# Altium footprint library Toi Library.PcbLib: 740 footprints (part 2 of 47)
Each footprint in its own frame and in the unit in brackets; x right, y up, seen from the top. Pads: shape width x height; smd on the part's side, far side on the other; paste and mask are expansions set on the pad; w line width, h text height; cw(c..) or ccw(c..) is an arc to the next point about the centre after c.
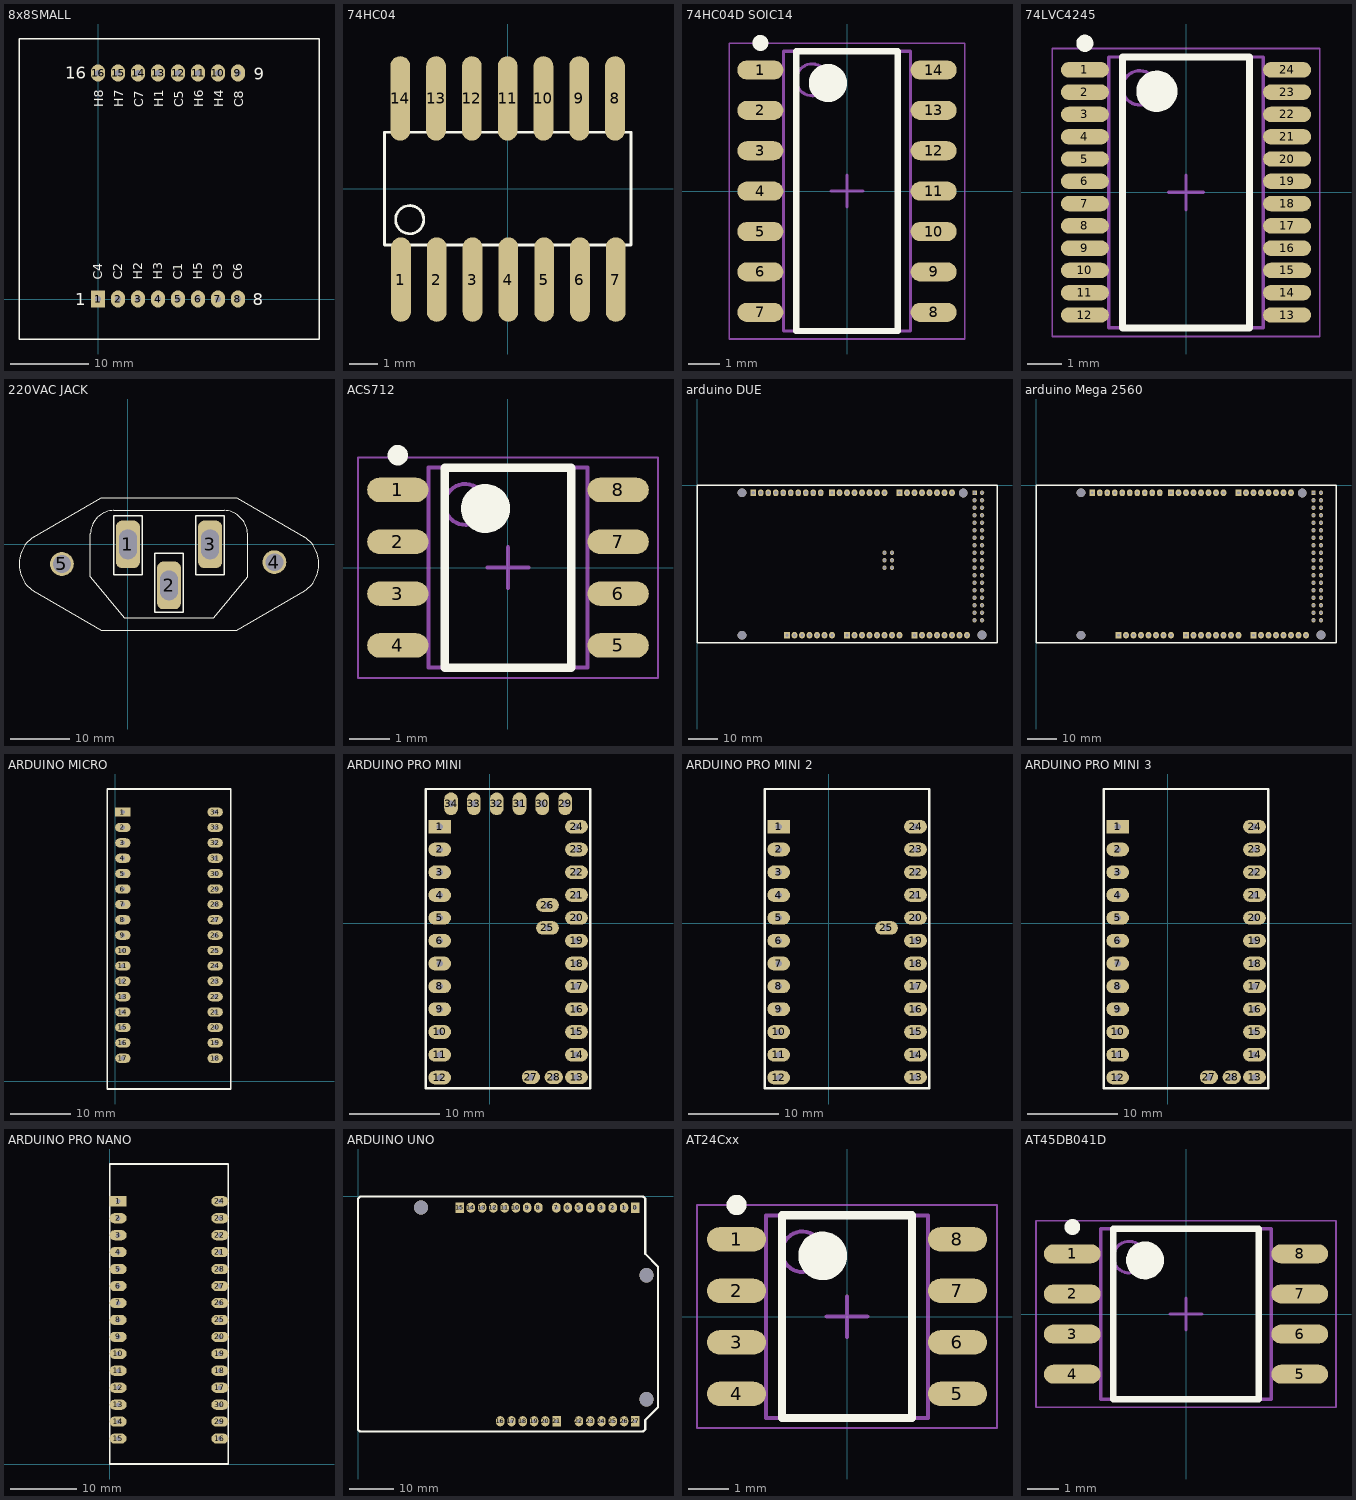
[diagram p1: the footprints below, top view; thin cyan lines are the x and y axes]

## 8x8SMALL [mil] "M15088, Matrix 8x8 - Body 38 X 38mm"
height 314.96
pads (16):
  rect 70x85 hole 31: 1(0,0)
  oval 70x85 hole 31: 2(100,0) 3(200,0) 4(300,0) 5(400,0) 6(500,0) 7(600,0) 8(700,0) 9(700,1129.92) 10(600,1129.92) 11(500,1129.92) 12(400,1129.92) 13(300,1129.92) 14(200,1129.92) 15(100,1129.92) 16(0,1129.92)
Top Overlay:
  lines w7: -395,-200 -395,1300 1105,1300 1105,-200 -395,-200
  text "H1" at 327.49,960 h45
  text "H2" at 222.49,96 h45
  text "H3" at 322.49,96 h45
  text "H4" at 627.49,960 h45
  text "16" at -165,1100 h60
  text "9" at 780,1095 h60
  text "8" at 775,-30 h60
  text "1" at -115,-30 h60
  text "C4" at 22.49,96 h45
  text "C3" at 622.49,96 h45
  text "C2" at 122.49,96 h45
  text "C1" at 422.49,96 h45
  text "C5" at 427.49,960 h45
  text "H5" at 522.49,96 h45
  text "H6" at 527.49,960 h45
  text "C6" at 722.49,96 h45
  text "H7" at 127.49,960 h45
  text "C7" at 227.49,960 h45
  text "H8" at 27.49,960 h45
  text "C8" at 727.49,960 h45

## 74HC04 [mm] "SOIC, 14-Leads, Body 8.7x3.9mm, Pitch 1.27mm, IPC Low Density"
height 1.75
pads (14):
  oval 0.7x3 smd: 1(-3.785,-3.226) 2(-2.515,-3.226) 3(-1.245,-3.226) 4(0.025,-3.226) 5(1.295,-3.226) 6(2.565,-3.226) 7(3.835,-3.226) 8(3.81,3.2) 9(2.54,3.2) 10(1.27,3.2) 11(0,3.2) 12(-1.27,3.2) 13(-2.54,3.2) 14(-3.81,3.2)
Top Layer:
  lines w0.254: 0,-3.2 0.025,-3.226
Top Overlay:
  circle w0.1: c-3.475,-1.1 r0.5
  lines w0.1: -4.375,-2 -4.375,2 4.375,2 4.375,-2 -4.375,-2
3D body "User Library-SOP14-p127-780.step": height 1.1, standoff 0, extent -5.08,-3.642 5.12,3.658

## 74HC04D SOIC14 [mm] "SOIC, 14-Leads, Body 8.65x3.90mm, Pitch 1.27mm, IPC Medium Density"
height 1.75
pads (14):
  oval 1.45x0.6 smd: 1(-2.725,3.81) 2(-2.725,2.54) 3(-2.725,1.27) 4(-2.725,0) 5(-2.725,-1.27) 6(-2.725,-2.54) 7(-2.725,-3.81) 8(2.725,-3.81) 9(2.725,-2.54) 10(2.725,-1.27) 11(2.725,0) 12(2.725,1.27) 13(2.725,2.54) 14(2.725,3.81)
Top Overlay:
  circle w0.25: c-2.725,4.66 r0.125
  circle w0.6: c-0.6,3.4 r0.3
  lines w0.2: -1.6,-4.4 -1.6,4.4 1.6,4.4 1.6,-4.4 -1.6,-4.4
Mechanical 13:
  circle w0.1: c-1.1,3.5 r0.5
  lines w0.1: -2,-4.4 -2,4.4 2,4.4 2,-4.4 -2,-4.4
Mechanical 15:
  lines w0.05: -3.7,-4.65 -3.7,4.65 3.7,4.65 3.7,-4.65 -3.7,-4.65
  lines w0.1: -0.5,0 0.5,0 ; 0,-0.5 0,0.5
3D body "74HC04D SOIC14.step": height 1.75, standoff 0, extent -3,-4.4 3,4.4

## 74LVC4245 [mm] "TSOP, 24-Leads, Body 7.80x4.40mm, Pitch 0.65mm, IPC Medium Density"
height 1
pads (24):
  oval 1.4x0.45 smd: 1(-2.95,3.575) 2(-2.95,2.925) 3(-2.95,2.275) 4(-2.95,1.625) 5(-2.95,0.975) 6(-2.95,0.325) 7(-2.95,-0.325) 8(-2.95,-0.975) 9(-2.95,-1.625) 10(-2.95,-2.275) 11(-2.95,-2.925) 12(-2.95,-3.575) 13(2.95,-3.575) 14(2.95,-2.925) 15(2.95,-2.275) 16(2.95,-1.625) 17(2.95,-0.975) 18(2.95,-0.325) 19(2.95,0.325) 20(2.95,0.975) 21(2.95,1.625) 22(2.95,2.275) 23(2.95,2.925) 24(2.95,3.575)
Top Overlay:
  circle w0.25: c-2.95,4.35 r0.125
  circle w0.6: c-0.85,2.95 r0.3
  lines w0.2: -1.85,-3.95 -1.85,3.95 1.85,3.95 1.85,-3.95 -1.85,-3.95
Mechanical 13:
  circle w0.1: c-1.35,3.05 r0.5
  lines w0.1: -2.25,-3.95 -2.25,3.95 2.25,3.95 2.25,-3.95 -2.25,-3.95
Mechanical 15:
  lines w0.05: -3.9,-4.2 -3.9,4.2 3.9,4.2 3.9,-4.2 -3.9,-4.2
  lines w0.1: -0.5,0 0.5,0 ; 0,-0.5 0,0.5
3D body "74LVC4245.step": height 1, standoff 0, extent -3.2,-3.95 3.2,3.95

## 220VAC JACK [mm]
pads (5):
  rrect50% 4x8 hole 3 slot 5 at 90 deg: 1(0,0) 2(6.903,-6.903) 3(13.807,0)
  round 4 hole 3: 4(24.612,-3.001) 5(-11.105,-3.302)
Top Overlay:
  lines w0.2: -15.923,-7.804 -4.486,-14.407 ; -15.923,1.201 -4.486,7.804 ; -15.908,-7.804 cw(c-12.887,-3.302) -15.908,1.201 ; -4.502,-14.407 18.309,-14.407 ; -4.502,7.804 18.309,7.804 ; 18.293,-14.406 29.73,-7.803 ; 18.293,7.804 29.73,1.201 ; 29.714,-7.804 ccw(c26.694,-3.302) 29.714,1.201 ; -6.303,-5.403 -0.6,-12.306 14.407,-12.306 20.11,-5.403 20.11,1.801 ccw(c15.997,1.59) 16.208,5.703 -2.401,5.703 ccw(c-2.251,1.651) -6.303,1.801 -6.303,-5.403
  lines w0.254: -2.401,-5.102 -2.401,4.802 2.401,4.802 2.401,-5.102 -2.401,-5.102 ; 4.502,-11.405 4.502,-1.501 9.304,-1.501 9.304,-11.405 4.502,-11.405 ; 11.405,-5.102 11.405,4.802 16.208,4.802 16.208,-5.102 11.405,-5.102

## ACS712 [mm] "SOIC, 8-Leads, Body 4.90x3.90mm, Pitch 1.27mm, IPC Medium Density"
height 2.65
pads (8):
  oval 1.5x0.6 smd: 1(-2.7,1.905) 2(-2.7,0.635) 3(-2.7,-0.635) 4(-2.7,-1.905) 5(2.7,-1.905) 6(2.7,-0.635) 7(2.7,0.635) 8(2.7,1.905)
Top Overlay:
  circle w0.6: c-0.55,1.45 r0.3
  circle w0.25: c-2.7,2.755 r0.125
  lines w0.2: -1.55,-2.45 1.55,-2.45 1.55,2.45 -1.55,2.45 -1.55,-2.45
Mechanical 13:
  circle w0.1: c-1.05,1.55 r0.5
  lines w0.1: -1.95,-2.45 1.95,-2.45 1.95,2.45 -1.95,2.45 -1.95,-2.45
Mechanical 15:
  lines w0.05: -3.675,-2.7 3.675,-2.7 3.675,2.7 -3.675,2.7 -3.675,-2.7
  lines w0.1: -0.5,0 0.5,0 ; 0,-0.5 0,0.5
3D body "ACS712.step": height 2.65, standoff 0, extent -3,-2.45 3,2.45

## arduino DUE [mil]
pads (91):
  oval 75x90 hole 45: 0(2500,-100) 1(2400,-100) 2(2300,-100) 3(2200,-100) 4(2100,-100) 5(2000,-100) 6(1900,-100) 8(1650,-101) 9(1550,-101) 10(1450,-101) 11(1350,-101) 12(1250,-101) 13(1150,-101) 15(2800,-100) 16(2900,-100) 17(3000,-100) 18(3100,-100) 19(3200,-100) 20(3300,-100) 21(3400,-100) 55(2100,-1999) 56(2200,-1999) 57(2300,-1999) 58(2400,-1999) 59(2500,-1999) 60(2600,-1999) 61(2700,-1999) 63(3000,-1999) 64(3100,-1999) 65(3200,-1999) 66(3300,-1999) 67(3400,-1999) 68(3500,-1999) 69(3600,-1999) 70(850,-101) 81(1800,-1999) 82(1500,-1999) 83(1400,-1999) 84(1700,-1999) 85(1600,-1999) 86(1300,-1999) 87(1050,-101) 88(950,-101)
  rect 75x90 hole 45: 7(1800,-100) 14(2700,-100) 54(2000,-1999) 62(2900,-1999) 71(750,-101) 78(1200,-1999)
  round 60 hole 45: 22(3700,-200) 23(3800,-200) 24(3700,-300) 25(3800,-300) 26(3700,-400) 27(3800,-400) 28(3700,-500) 29(3800,-500) 30(3700,-600) 31(3800,-600) 32(3700,-700) 33(3800,-700) 34(3700,-800) 35(3800,-800) 36(3700,-900) 37(3800,-900) 38(3700,-1000) 39(3800,-1000) 40(3700,-1100) 41(3800,-1100) 42(3700,-1200) 43(3800,-1200) 44(3700,-1300) 45(3800,-1300) 46(3700,-1400) 47(3800,-1400) 48(3700,-1500) 49(3800,-1500) 50(3700,-1600) 51(3800,-1600) 52(3700,-1700) 53(3800,-1700) 73(3800,-100) 74(2500,-900) 75(2600,-1000) 76(2500,-1000) 77(2500,-1100) 79(3700,-1800) 80(3800,-1800) 89(2600,-900) 90(2600,-1100)
  rect 60x60 hole 45: 72(3700,-100)
via 3550,-101 diameter 118.11 hole 118.11
via 3800,-1998 diameter 118.11 hole 118.11
via 600,-2000 diameter 118.11 hole 118.11
via 600,-100 diameter 118.11 hole 118.11
Top Overlay:
  lines w20: 600,0 0,0 ; 750,-101 751,-100 ; 950,-101 951,-100 ; 0,0 0,-2100 4000,-2100 4000,0 0,0
3D body "User Library-ARDUINO DUE.STEP": height -235.43, standoff -810.24, extent -74.01,-2100 4000,0

## arduino Mega 2560 [mil]
pads (86):
  oval 75x90 hole 34: 0(2500,-100) 1(2400,-100) 2(2300,-100) 3(2200,-100) 4(2100,-100) 5(2000,-100) 6(1900,-100) 8(1650,-101) 9(1550,-101) 10(1450,-101) 11(1350,-101) 12(1250,-101) 13(950,-101) 13(1150,-101) 15(2800,-100) 16(2900,-100) 17(3000,-100) 18(3100,-100) 19(3200,-100) 20(3300,-100) 21(3400,-100) 57(2100,-2000) 58(2200,-2000) 59(2300,-2000) 60(2400,-2000) 61(2500,-2000) 62(2600,-2000) 63(2700,-2000) 65(3000,-1999) 66(3100,-1999) 67(3200,-1999) 68(3300,-1999) 69(3400,-1999) 70(3500,-1999) 71(3600,-1999) 72(1800,-1999) 73(1700,-1999) 74(1600,-1999) 75(1300,-1999) 75(1500,-1999) 76(1200,-1999) 76(1400,-1999) 78(850,-101) 78(1050,-101)
  rect 75x90 hole 34: 7(1800,-100) 14(2700,-100) 56(2000,-2000) 64(2900,-1999) 77(1100,-1999) 79(750,-101)
  round 59.06 hole 35.43: 22(3700,-200) 23(3800,-200) 24(3700,-300) 25(3800,-300) 26(3700,-400) 27(3800,-400) 28(3700,-500) 29(3800,-500) 30(3700,-600) 31(3800,-600) 32(3700,-700) 33(3800,-700) 34(3700,-800) 35(3800,-800) 36(3700,-900) 37(3800,-900) 38(3700,-1000) 39(3800,-1000) 40(3700,-1100) 41(3800,-1100) 42(3700,-1200) 43(3800,-1200) 44(3700,-1300) 45(3800,-1300) 46(3700,-1400) 47(3800,-1400) 48(3700,-1500) 49(3800,-1500) 50(3700,-1600) 51(3800,-1600) 52(3700,-1700) 53(3800,-1700) 54(3800,-1800) 55(3700,-1800) ""(3800,-100)
  rect 59.06x59.06 hole 35.43: ""(3700,-100)
via 600,-100 diameter 118.11 hole 118.11
via 600,-2000 diameter 118.11 hole 118.11
via 3800,-1998 diameter 118.11 hole 118.11
via 3550,-101 diameter 118.11 hole 118.11
Top Overlay:
  lines w20: 600,0 0,0 ; 750,-101 751,-100 ; 950,-101 951,-100 ; 0,0 4000,0 4000,-2100 0,-2100 0,0
3D body "User Library-arduino_MEGA2650-1.STEP": height 485.04, standoff -115.35, extent -251,-2099 3999,1

## ARDUINO MICRO [mil]
pads (34):
  rect 100x60 hole 28: 1(50,1750)
  oval 100x60 hole 28: 2(50,1650) 3(50,1550) 4(50,1450) 5(50,1350) 6(50,1250) 7(50,1150) 8(50,1050) 9(50,950) 10(50,850) 11(50,750) 12(50,650) 13(50,550) 14(50,450) 15(50,350) 16(50,250) 17(50,150) 18(650,150) 19(650,250) 20(650,350) 21(650,450) 22(650,550) 23(650,650) 24(650,750) 25(650,850) 26(650,950) 27(650,1050) 28(650,1150) 29(650,1250) 30(650,1350) 31(650,1450) 32(650,1550) 33(650,1650) 34(650,1750)
Top Overlay:
  lines w10: -50,-50 750,-50 750,1900 -50,1900 -50,-50
3D body "User Library-ArduinoMicro.STEP": height 408, standoff -275, extent -1,-40 701,1900

## ARDUINO PRO MINI [mil]
pads (34):
  rect 100x60 hole 28: 1(-218.9,422.6)
  oval 100x60 hole 28: 2(-218.9,322.6) 3(-218.9,222.6) 4(-218.9,122.6) 5(-218.9,22.6) 6(-218.9,-77.4) 7(-218.9,-177.4) 8(-218.9,-277.4) 9(-218.9,-377.4) 10(-218.9,-477.4) 11(-218.9,-577.4) 12(-218.9,-677.4) 13(381.1,-675.6) 14(381.1,-577.4) 15(381.1,-477.4) 16(381.1,-377.4) 17(381.1,-277.4) 18(381.1,-177.4) 19(381.1,-77.4) 20(381.1,22.6) 21(381.1,122.6) 22(381.1,222.6) 23(381.1,322.6) 24(381.1,422.6) 25(253.7,-21.2) 26(253.7,78.8)
  oval 80x60 hole 28: 27(181.1,-675.6) 28(281.1,-675.6)
  oval 60x100 hole 28: 29(331.1,522.6) 30(231.1,522.6) 31(131.1,522.6) 32(31.1,522.6) 33(-68.9,522.6) 34(-168.9,522.6)
Top Overlay:
  lines w10: -280.1,-724.2 -280.1,587.6 441.3,587.6 441.3,-724.2 -280.1,-724.2
3D body "User Library-arduino pro mini.STEP": height -100, standoff -170.87, extent -269.39,-718.8 431.39,580.41

## ARDUINO PRO MINI 2 [mil]
pads (25):
  rect 100x60 hole 28: 1(-218.9,422.6)
  oval 100x60 hole 28: 2(-218.9,322.6) 3(-218.9,222.6) 4(-218.9,122.6) 5(-218.9,22.6) 6(-218.9,-77.4) 7(-218.9,-177.4) 8(-218.9,-277.4) 9(-218.9,-377.4) 10(-218.9,-477.4) 11(-218.9,-577.4) 12(-218.9,-677.4) 13(381.1,-675.6) 14(381.1,-577.4) 15(381.1,-477.4) 16(381.1,-377.4) 17(381.1,-277.4) 18(381.1,-177.4) 19(381.1,-77.4) 20(381.1,22.6) 21(381.1,122.6) 22(381.1,222.6) 23(381.1,322.6) 24(381.1,422.6) 25(253.7,-21.2)
Top Overlay:
  lines w10: -280.1,-724.2 -280.1,587.6 441.3,587.6 441.3,-724.2 -280.1,-724.2
3D body "User Library-arduino pro mini.STEP": height -100, standoff -170.87, extent -269.39,-718.8 431.39,580.41

## ARDUINO PRO MINI 3 [mil]
pads (26):
  rect 100x60 hole 28: 1(-218.9,422.6)
  oval 100x60 hole 28: 2(-218.9,322.6) 3(-218.9,222.6) 4(-218.9,122.6) 5(-218.9,22.6) 6(-218.9,-77.4) 7(-218.9,-177.4) 8(-218.9,-277.4) 9(-218.9,-377.4) 10(-218.9,-477.4) 11(-218.9,-577.4) 12(-218.9,-677.4) 13(381.1,-675.6) 14(381.1,-577.4) 15(381.1,-477.4) 16(381.1,-377.4) 17(381.1,-277.4) 18(381.1,-177.4) 19(381.1,-77.4) 20(381.1,22.6) 21(381.1,122.6) 22(381.1,222.6) 23(381.1,322.6) 24(381.1,422.6)
  oval 80x60 hole 28: 27(181.1,-675.6) 28(281.1,-675.6)
Top Overlay:
  lines w10: -280.1,-724.2 -280.1,587.6 441.3,587.6 441.3,-724.2 -280.1,-724.2
3D body "User Library-arduino pro mini.STEP": height -100, standoff -170.87, extent -269.39,-718.8 431.39,580.41

## ARDUINO PRO NANO [mil]
pads (30):
  rect 100x60 hole 28: 1(50,1550)
  oval 100x60 hole 28: 2(50,1450) 3(50,1350) 4(50,1250) 5(50,1150) 6(50,1050) 7(50,950) 8(50,850) 9(50,750) 10(50,650) 11(50,550) 12(50,450) 13(50,350) 14(50,250) 15(50,150) 16(650,150) 17(650,450) 18(650,550) 19(650,650) 20(650,750) 21(650,1250) 22(650,1350) 23(650,1450) 24(650,1550) 25(650,850) 26(650,950) 27(650,1050) 28(650,1150) 29(650,250) 30(650,350)
Top Overlay:
  lines w10: 0,0 0,1770 700,1770 700,0 0,0
3D body "User Library-arduino_nano.STEP": height 507.64, standoff -224.65, extent -5,-70.83 703.66,1700.83

## ARDUINO UNO [mil]
pads (28):
  rect 75x90 hole 34: 0(2460.63,-100) 15(901,-100) 21(1762,-1995) 27(2460.63,-1995)
  oval 75x90 hole 34: 1(2360.63,-100) 2(2260.63,-100) 3(2160.63,-100) 4(2060.63,-100) 5(1960.63,-100) 6(1860.63,-100) 7(1760.63,-100) 8(1601,-100) 9(1501,-100) 10(1401,-100) 11(1301,-100) 12(1201,-100) 13(1101,-100) 14(1001,-100) 16(1262,-1995) 17(1362,-1995) 18(1462,-1995) 19(1562,-1995) 20(1662,-1995) 22(1960.63,-1995) 23(2060.63,-1995) 24(2160.63,-1995) 25(2260.63,-1995) 26(2360.63,-1995)
via 2559.06,-1799 diameter 125.98 hole 125.98
via 2558.72,-698.66 diameter 125.98 hole 125.98
via 559,-99 diameter 125.98 hole 125.98
Top Overlay:
  lines w20: 0,-2069.61 17,-2086.61 2529.39,-2086.61 2546,-2070 2548.53,-2067.47 2548.53,-1984.53 2662,-1871.06 2662,-622.94 2548.03,-508.97 2548,-508.94 2548,-19 2529,0 20,0 0,-20 0,-2069.61
3D body "User Library-arduino_uno.STEP": height 485.04, standoff -115.35, extent -291,-2099 2659,1

## AT24Cxx [mm] "SOIC, 8-Leads, Body 4.90x3.90mm, Pitch 1.27mm, IPC Medium Density"
height 1.75
pads (8):
  oval 1.45x0.6 smd: 1(-2.725,1.905) 2(-2.725,0.635) 3(-2.725,-0.635) 4(-2.725,-1.905) 5(2.725,-1.905) 6(2.725,-0.635) 7(2.725,0.635) 8(2.725,1.905)
Top Overlay:
  circle w0.6: c-0.6,1.5 r0.3
  circle w0.25: c-2.725,2.755 r0.125
  lines w0.2: -1.6,-2.5 1.6,-2.5 1.6,2.5 -1.6,2.5 -1.6,-2.5
Mechanical 13:
  circle w0.1: c-1.1,1.6 r0.5
  lines w0.1: -2,-2.5 2,-2.5 2,2.5 -2,2.5 -2,-2.5
Mechanical 15:
  lines w0.05: -3.7,-2.75 3.7,-2.75 3.7,2.75 -3.7,2.75 -3.7,-2.75
  lines w0.1: -0.5,0 0.5,0 ; 0,-0.5 0,0.5
3D body "AT24Cxx.step": height 1.75, standoff 0, extent -3,-2.5 3,2.5

## AT45DB041D [mm] "SOIC, 8-Leads, Body 5.27x5.30mm, Pitch 1.27mm, IPC Medium Density"
height 2.2
pads (8):
  oval 1.8x0.6 smd: 1(-3.6,1.905) 2(-3.6,0.635) 3(-3.6,-0.635) 4(-3.6,-1.905) 5(3.6,-1.905) 6(3.6,-0.635) 7(3.6,0.635) 8(3.6,1.905)
Top Overlay:
  circle w0.25: c-3.6,2.755 r0.125
  circle w0.6: c-1.3,1.7 r0.3
  lines w0.2: -2.3,-2.7 -2.3,2.7 2.3,2.7 2.3,-2.7 -2.3,-2.7
Mechanical 13:
  circle w0.1: c-1.8,1.8 r0.5
  lines w0.1: -2.7,-2.7 -2.7,2.7 2.7,2.7 2.7,-2.7 -2.7,-2.7
Mechanical 15:
  lines w0.05: -4.75,-2.95 -4.75,2.95 4.75,2.95 4.75,-2.95 -4.75,-2.95
  lines w0.1: -0.5,0 0.5,0 ; 0,-0.5 0,0.5
3D body "AT45DB041D.step": height 2.2, standoff 0, extent -4,-2.7 4,2.7